# Altium schematic symbol library MCU_Microchip_ATmega.SchLib: 440 symbols (part 5 of 7) (continued)
## ATxmega16C4-M (continued)

## ATxmega16D4-A
designator *  value ATxmega16D4-A  Reference: U
ki_keywords: AVR 8/16bit Microcontroller XMegaAVR; ki_description: 32MHz, 16kB Flash, 4kB Boot, 2kB SRAM, 1kB EEPROM, JTAG, TQFP-44; ki_fp_filters: TQFP*10x10mm*P0.8mm*; Footprint: Package_QFP:TQFP-44_10x10mm_P0.8mm; Datasheet: http://ww1.microchip.com/downloads/en/DeviceDoc/Atmel-8135-8-and-16-bit-AVR-microcontroller-ATxmega16D4-32D4-64D4-128D4_datasheet.pdf
pins: 1 PA5, 2 PA6, 3 PA7, 4 AREF/PB0, 5 PB1, 6 PB2, 7 PB3, 8 GND, 9 VCC, 10 PC0, 11 PC1, 12 PC2, 13 PC3, 14 PC4, 15 PC5, 16 PC6, 17 PC7, 18 GND hidden, 19 VCC hidden, 20 PD0, 21 PD1, 22 PD2, 23 PD3, 24 PD4, 25 PD5, 26 PD6, 27 PD7, 28 PE0, 29 PE1, 30 GND hidden, 31 VCC hidden, 32 PE2, 33 PE3, 34 PDI_DATA, 35 ~{{RESET}/PDI_CLK}, 36 PR0/XTAL2, 37 PR1/XTAL1, 38 GND hidden, 39 AVCC, 40 AREF/PA0, 41 PA1, 42 PA2, 43 PA3, 44 PA4

## ATxmega16D4-C
designator *  value ATxmega16D4-C  Reference: U
ki_keywords: AVR 8/16bit Microcontroller XMegaAVR; ki_description: 32MHz, 16kB Flash, 4kB Boot, 2kB SRAM, 1kB EEPROM, JTAG, VFBGA-49; ki_fp_filters: VFBGA*5.0x5.0mm*Layout7x7*P0.65mm*; Footprint: Package_BGA:VFBGA-49_5.0x5.0mm_Layout7x7_P0.65mm; Datasheet: http://ww1.microchip.com/downloads/en/DeviceDoc/Atmel-8135-8-and-16-bit-AVR-microcontroller-ATxmega16D4-32D4-64D4-128D4_datasheet.pdf
pins: A1 PA3, A2 AVCC, A3 GND, A4 PR1/XTAL1, A5 PR0/XTAL2, A6 PDI_DATA, A7 PE3, B1 PA4, B2 PA1, B3 AREF/PA0, B4 GND hidden, B5 ~{{RESET}/PDI_CLK}, B6 PE2, B7 VCC, C1 PA5, C2 PA2, C3 PA6, C4 PA7, C5 GND hidden, C6 PE1, C7 GND hidden, D1 PB1, D2 PB2, D3 PB3, D4 AREF/PB0, D5 GND hidden, D6 PD7, D7 PE0, E1 GND hidden, E2 GND hidden, E3 PC3, E4 GND hidden, E5 PD4, E6 PD5, E7 PD6, F1 VCC hidden, F2 PC0, F3 PC4, F4 PC6, F5 PD0, F6 PD1, F7 PD3, G1 PC1, G2 PC2, G3 PC5, G4 PC7, G5 GND hidden, G6 VCC hidden, G7 PD2

## ATxmega16D4-M
designator *  value ATxmega16D4-M  Reference: U
ki_keywords: AVR 8/16bit Microcontroller XMegaAVR; ki_description: 32MHz, 16kB Flash, 4kB Boot, 2kB SRAM, 1kB EEPROM, JTAG, QFN-44; ki_fp_filters: QFN*1EP*7x7mm*P0.5mm*; Footprint: Package_DFN_QFN:QFN-44-1EP_7x7mm_P0.5mm_EP5.2x5.2mm; Datasheet: http://ww1.microchip.com/downloads/en/DeviceDoc/Atmel-8135-8-and-16-bit-AVR-microcontroller-ATxmega16D4-32D4-64D4-128D4_datasheet.pdf
pins: 1 PA5, 2 PA6, 3 PA7, 4 AREF/PB0, 5 PB1, 6 PB2, 7 PB3, 8 GND, 9 VCC, 10 PC0, 11 PC1, 12 PC2, 13 PC3, 14 PC4, 15 PC5, 16 PC6, 17 PC7, 18 GND hidden, 19 VCC hidden, 20 PD0, 21 PD1, 22 PD2, 23 PD3, 24 PD4, 25 PD5, 26 PD6, 27 PD7, 28 PE0, 29 PE1, 30 GND hidden, 31 VCC hidden, 32 PE2, 33 PE3, 34 PDI_DATA, 35 ~{{RESET}/PDI_CLK}, 36 PR0/XTAL2, 37 PR1/XTAL1, 38 GND hidden, 39 AVCC, 40 AREF/PA0, 41 PA1, 42 PA2, 43 PA3, 44 PA4, 45 GND hidden

## ATxmega16E5-A
designator *  value ATxmega16E5-A  Reference: U
ki_keywords: AVR 8/16bit Microcontroller XMegaAVR; ki_description: 32MHz, 16kB Flash, 4kB Boot, 2kB SRAM, 512B EEPROM, TQFP-32; ki_fp_filters: TQFP*7x7mm*P0.8mm*; Footprint: Package_QFP:TQFP-32_7x7mm_P0.8mm; Datasheet: http://ww1.microchip.com/downloads/en/DeviceDoc/Atmel-8153-8-and-16-bit-AVR-Microcontroller-XMEGA-E-ATxmega8E5-ATxmega16E5-ATxmega32E5_Datasheet.pdf
pins: 1 GND, 2 PA4, 3 PA3, 4 PA2, 5 PA1, 6 AREF/PA0, 7 PDI_DATA, 8 ~{{RESET}/PDI_CLK}, 9 PC7, 10 PC6, 11 PC5, 12 PC4, 13 PC3, 14 PC2, 15 PC1, 16 PC0, 17 VCC, 18 GND hidden, 19 PR1/XTAL1, 20 PR0/XTAL2, 21 PD7, 22 PD6, 23 PD5, 24 PD4, 25 PD3, 26 PD2, 27 PD1, 28 PD0/AREF, 29 PA7, 30 PA6, 31 PA5, 32 AVCC

## ATxmega16E5-M
designator *  value ATxmega16E5-M  Reference: U
ki_keywords: AVR 8/16bit Microcontroller XMegaAVR; ki_description: 32MHz, 16kB Flash, 4kB Boot, 2kB SRAM, 512B EEPROM, QFN-32; ki_fp_filters: QFN*1EP*5x5mm*P0.5mm*; Footprint: Package_DFN_QFN:QFN-32-1EP_5x5mm_P0.5mm_EP3.1x3.1mm; Datasheet: http://ww1.microchip.com/downloads/en/DeviceDoc/Atmel-8153-8-and-16-bit-AVR-Microcontroller-XMEGA-E-ATxmega8E5-ATxmega16E5-ATxmega32E5_Datasheet.pdf
pins: 1 GND, 2 PA4, 3 PA3, 4 PA2, 5 PA1, 6 AREF/PA0, 7 PDI_DATA, 8 ~{{RESET}/PDI_CLK}, 9 PC7, 10 PC6, 11 PC5, 12 PC4, 13 PC3, 14 PC2, 15 PC1, 16 PC0, 17 VCC, 18 GND hidden, 19 PR1/XTAL1, 20 PR0/XTAL2, 21 PD7, 22 PD6, 23 PD5, 24 PD4, 25 PD3, 26 PD2, 27 PD1, 28 PD0/AREF, 29 PA7, 30 PA6, 31 PA5, 32 AVCC, 33 GND hidden

## ATxmega16E5-M4
designator *  value ATxmega16E5-M4  Reference: U
ki_keywords: AVR 8/16bit Microcontroller XMegaAVR; ki_description: 32MHz, 16kB Flash, 4kB Boot, 2kB SRAM, 512B EEPROM, QFN-32; ki_fp_filters: QFN*1EP*4x4mm*P0.4mm*; Footprint: Package_DFN_QFN:QFN-32-1EP_4x4mm_P0.4mm_EP2.9x2.9mm; Datasheet: http://ww1.microchip.com/downloads/en/DeviceDoc/Atmel-8153-8-and-16-bit-AVR-Microcontroller-XMEGA-E-ATxmega8E5-ATxmega16E5-ATxmega32E5_Datasheet.pdf
pins: 1 GND, 2 PA4, 3 PA3, 4 PA2, 5 PA1, 6 AREF/PA0, 7 PDI_DATA, 8 ~{{RESET}/PDI_CLK}, 9 PC7, 10 PC6, 11 PC5, 12 PC4, 13 PC3, 14 PC2, 15 PC1, 16 PC0, 17 VCC, 18 GND hidden, 19 PR1/XTAL1, 20 PR0/XTAL2, 21 PD7, 22 PD6, 23 PD5, 24 PD4, 25 PD3, 26 PD2, 27 PD1, 28 PD0/AREF, 29 PA7, 30 PA6, 31 PA5, 32 AVCC, 33 GND hidden

## ATxmega32A4U-A
designator *  value ATxmega32A4U-A  Reference: U
ki_keywords: AVR 8/16bit Microcontroller XMegaAVR; ki_description: 32MHz, 32kB Flash, 4kB Boot, 4kB SRAM, 1kB EEPROM, JTAG, USB, TQFP-44; ki_fp_filters: TQFP*10x10mm*P0.8mm*; Footprint: Package_QFP:TQFP-44_10x10mm_P0.8mm; Datasheet: http://ww1.microchip.com/downloads/en/DeviceDoc/Atmel-8387-8-and16-bit-AVR-Microcontroller-XMEGA-A4U_Datasheet.pdf
pins: 1 PA5, 2 PA6, 3 PA7, 4 AREFB/PB0, 5 PB1, 6 PB2, 7 PB3, 8 GND, 9 VCC, 10 PC0, 11 PC1, 12 PC2, 13 PC3, 14 PC4, 15 PC5, 16 PC6, 17 PC7, 18 GND hidden, 19 VCC hidden, 20 PD0, 21 PD1, 22 PD2, 23 PD3, 24 PD4, 25 PD5, 26 PD6, 27 PD7, 28 PE0, 29 PE1, 30 GND hidden, 31 VCC hidden, 32 PE2, 33 PE3, 34 PDI_DATA, 35 ~{{RESET}/PDI_CLK}, 36 PR0/XTAL2, 37 PR1/XTAL1, 38 GND hidden, 39 AVCC, 40 AREFA/PA0, 41 PA1, 42 PA2, 43 PA3, 44 PA4

## ATxmega32A4U-C
designator *  value ATxmega32A4U-C  Reference: U
ki_keywords: AVR 8/16bit Microcontroller XMegaAVR; ki_description: 32MHz, 32kB Flash, 4kB Boot, 4kB SRAM, 1kB EEPROM, JTAG, USB, VFBGA-49; ki_fp_filters: VFBGA*5.0x5.0mm*Layout7x7*P0.65mm*; Footprint: Package_BGA:VFBGA-49_5.0x5.0mm_Layout7x7_P0.65mm; Datasheet: http://ww1.microchip.com/downloads/en/DeviceDoc/Atmel-8387-8-and16-bit-AVR-Microcontroller-XMEGA-A4U_Datasheet.pdf
pins: A1 PA3, A2 AVCC, A3 GND, A4 PR1/XTAL1, A5 PR0/XTAL2, A6 PDI_DATA, A7 PE3, B1 PA4, B2 PA1, B3 AREFA/PA0, B4 GND hidden, B5 ~{{RESET}/PDI_CLK}, B6 PE2, B7 VCC, C1 PA5, C2 PA2, C3 PA6, C4 PA7, C5 GND hidden, C6 PE1, C7 GND hidden, D1 PB1, D2 PB2, D3 PB3, D4 AREFB/PB0, D5 GND hidden, D6 PD7, D7 PE0, E1 GND hidden, E2 GND hidden, E3 PC3, E4 GND hidden, E5 PD4, E6 PD5, E7 PD6, F1 VCC hidden, F2 PC0, F3 PC4, F4 PC6, F5 PD0, F6 PD1, F7 PD3, G1 PC1, G2 PC2, G3 PC5, G4 PC7, G5 GND hidden, G6 VCC hidden, G7 PD2

## ATxmega32A4U-M
designator *  value ATxmega32A4U-M  Reference: U
ki_keywords: AVR 8/16bit Microcontroller XMegaAVR; ki_description: 32MHz, 32kB Flash, 4kB Boot, 4kB SRAM, 1kB EEPROM, JTAG, USB, QFN-44; ki_fp_filters: QFN*1EP*7x7mm*P0.5mm*; Footprint: Package_DFN_QFN:QFN-44-1EP_7x7mm_P0.5mm_EP5.2x5.2mm; Datasheet: http://ww1.microchip.com/downloads/en/DeviceDoc/Atmel-8387-8-and16-bit-AVR-Microcontroller-XMEGA-A4U_Datasheet.pdf
pins: 1 PA5, 2 PA6, 3 PA7, 4 AREFB/PB0, 5 PB1, 6 PB2, 7 PB3, 8 GND, 9 VCC, 10 PC0, 11 PC1, 12 PC2, 13 PC3, 14 PC4, 15 PC5, 16 PC6, 17 PC7, 18 GND hidden, 19 VCC hidden, 20 PD0, 21 PD1, 22 PD2, 23 PD3, 24 PD4, 25 PD5, 26 PD6, 27 PD7, 28 PE0, 29 PE1, 30 GND hidden, 31 VCC hidden, 32 PE2, 33 PE3, 34 PDI_DATA, 35 ~{{RESET}/PDI_CLK}, 36 PR0/XTAL2, 37 PR1/XTAL1, 38 GND hidden, 39 AVCC, 40 AREFA/PA0, 41 PA1, 42 PA2, 43 PA3, 44 PA4, 45 GND hidden

## ATxmega32C3-A
designator *  value ATxmega32C3-A  Reference: U
ki_keywords: AVR 8/16bit Microcontroller XMegaAVR; ki_description: 32MHz, 32kB Flash, 4kB Boot, 4kB SRAM, 1kB EEPROM, JTAG, USB, TQFP-64; ki_fp_filters: TQFP*14x14mm*P0.8mm*; Footprint: Package_QFP:TQFP-64_14x14mm_P0.8mm; Datasheet: http://ww1.microchip.com/downloads/en/DeviceDoc/Atmel-8492-8-and-16-bit-AVR-microcontroller-ATxmega32C3_64C3_128C3_192C3_256C3_datasheet.pdf
pins: 1 PA3, 2 PA4, 3 PA5, 4 PA6, 5 PA7, 6 AREFB/PB0, 7 PB1, 8 PB2, 9 PB3, 10 PB4, 11 PB5, 12 PB6, 13 PB7, 14 GND, 15 VCC, 16 PC0, 17 PC1, 18 PC2, 19 PC3, 20 PC4, 21 PC5, 22 PC6, 23 PC7, 24 GND hidden, 25 VCC hidden, 26 PD0, 27 PD1, 28 PD2, 29 PD3, 30 PD4, 31 PD5, 32 PD6, 33 PD7, 34 GND hidden, 35 VCC hidden, 36 PE0, 37 PE1, 38 PE2, 39 PE3, 40 PE4, 41 PE5, 42 PE6, 43 PE7, 44 GND hidden, 45 VCC hidden, 46 PF0, 47 PF1, 48 PF2, 49 PF3, 50 PF4, 51 PF5, 52 GND hidden, 53 VCC hidden, 54 PF6, 55 PF7, 56 PDI_DATA, 57 ~{{RESET}/PDI_CLK}, 58 PR0/XTAL2, 59 PR1/XTAL1, 60 GND hidden, 61 AVCC, 62 AREFA/PA0, 63 PA1, 64 PA2

## ATxmega32C3-M
designator *  value ATxmega32C3-M  Reference: U
ki_keywords: AVR 8/16bit Microcontroller XMegaAVR; ki_description: 32MHz, 32kB Flash, 4kB Boot, 4kB SRAM, 1kB EEPROM, JTAG, USB, QFN-64; ki_fp_filters: QFN*1EP*9x9mm*P0.5mm*; Footprint: Package_DFN_QFN:QFN-64-1EP_9x9mm_P0.5mm_EP7.65x7.65mm; Datasheet: http://ww1.microchip.com/downloads/en/DeviceDoc/Atmel-8492-8-and-16-bit-AVR-microcontroller-ATxmega32C3_64C3_128C3_192C3_256C3_datasheet.pdf
pins: 1 PA3, 2 PA4, 3 PA5, 4 PA6, 5 PA7, 6 AREFB/PB0, 7 PB1, 8 PB2, 9 PB3, 10 PB4, 11 PB5, 12 PB6, 13 PB7, 14 GND, 15 VCC, 16 PC0, 17 PC1, 18 PC2, 19 PC3, 20 PC4, 21 PC5, 22 PC6, 23 PC7, 24 GND hidden, 25 VCC hidden, 26 PD0, 27 PD1, 28 PD2, 29 PD3, 30 PD4, 31 PD5, 32 PD6, 33 PD7, 34 GND hidden, 35 VCC hidden, 36 PE0, 37 PE1, 38 PE2, 39 PE3, 40 PE4, 41 PE5, 42 PE6, 43 PE7, 44 GND hidden, 45 VCC hidden, 46 PF0, 47 PF1, 48 PF2, 49 PF3, 50 PF4, 51 PF5, 52 GND hidden, 53 VCC hidden, 54 PF6, 55 PF7, 56 PDI_DATA, 57 ~{{RESET}/PDI_CLK}, 58 PR0/XTAL2, 59 PR1/XTAL1, 60 GND hidden, 61 AVCC, 62 AREFA/PA0, 63 PA1, 64 PA2, 65 GND hidden

## ATxmega32C4-A
designator *  value ATxmega32C4-A  Reference: U
ki_keywords: AVR 8/16bit Microcontroller XMegaAVR; ki_description: 32MHz, 32kB Flash, 4kB Boot, 4kB SRAM, 1kB EEPROM, JTAG, TQFP-44; ki_fp_filters: TQFP*10x10mm*P0.8mm*; Footprint: Package_QFP:TQFP-44_10x10mm_P0.8mm; Datasheet: http://ww1.microchip.com/downloads/en/DeviceDoc/Atmel-8493-8-and-32-bit-AVR-XMEGA-Microcontrollers-ATxmega16C4-ATxmega32C4_Datasheet.pdf
pins: 1 PA5, 2 PA6, 3 PA7, 4 AREFB/PB0, 5 PB1, 6 PB2, 7 PB3, 8 GND, 9 VCC, 10 PC0, 11 PC1, 12 PC2, 13 PC3, 14 PC4, 15 PC5, 16 PC6, 17 PC7, 18 GND hidden, 19 VCC hidden, 20 PD0, 21 PD1, 22 PD2, 23 PD3, 24 PD4, 25 PD5, 26 PD6, 27 PD7, 28 PE0, 29 PE1, 30 GND hidden, 31 VCC hidden, 32 PE2, 33 PE3, 34 PDI_DATA, 35 ~{{RESET}/PDI_CLK}, 36 PR0/XTAL1, 37 PR1/XTAL2, 38 GND hidden, 39 AVCC, 40 AREFA/PA0, 41 PA1, 42 PA2, 43 PA3, 44 PA4

## ATxmega32C4-C
designator *  value ATxmega32C4-C  Reference: U
ki_keywords: AVR 8/16bit Microcontroller XMegaAVR; ki_description: 32MHz, 32kB Flash, 4kB Boot, 4kB SRAM, 1kB EEPROM, JTAG, VFBGA-49; ki_fp_filters: VFBGA*5.0x5.0mm*Layout7x7*P0.65mm*; Footprint: Package_BGA:VFBGA-49_5.0x5.0mm_Layout7x7_P0.65mm; Datasheet: http://ww1.microchip.com/downloads/en/DeviceDoc/Atmel-8493-8-and-32-bit-AVR-XMEGA-Microcontrollers-ATxmega16C4-ATxmega32C4_Datasheet.pdf
pins: A1 PA3, A2 AVCC, A3 GND, A4 PR1/XTAL2, A5 PR0/XTAL1, A6 PDI_DATA, A7 PE3, B1 PA4, B2 PA1, B3 AREFA/PA0, B4 GND hidden, B5 ~{{RESET}/PDI_CLK}, B6 PE2, B7 VCC, C1 PA5, C2 PA2, C3 PA6, C4 PA7, C5 GND hidden, C6 PE1, C7 GND hidden, D1 PB1, D2 PB2, D3 PB3, D4 AREFB/PB0, D5 GND hidden, D6 PD7, D7 PE0, E1 GND hidden, E2 GND hidden, E3 PC3, E4 GND hidden, E5 PD4, E6 PD5, E7 PD6, F1 VCC hidden, F2 PC0, F3 PC4, F4 PC6, F5 PD0, F6 PD1, F7 PD3, G1 PC1, G2 PC2, G3 PC5, G4 PC7, G5 GND hidden, G6 VCC hidden, G7 PD2

## ATxmega32C4-M
designator *  value ATxmega32C4-M  Reference: U
ki_keywords: AVR 8/16bit Microcontroller XMegaAVR; ki_description: 32MHz, 32kB Flash, 4kB Boot, 4kB SRAM, 1kB EEPROM, JTAG, QFN-44; ki_fp_filters: QFN*1EP*7x7mm*P0.5mm*; Footprint: Package_DFN_QFN:QFN-44-1EP_7x7mm_P0.5mm_EP5.2x5.2mm; Datasheet: http://ww1.microchip.com/downloads/en/DeviceDoc/Atmel-8493-8-and-32-bit-AVR-XMEGA-Microcontrollers-ATxmega16C4-ATxmega32C4_Datasheet.pdf
pins: 1 PA5, 2 PA6, 3 PA7, 4 AREFB/PB0, 5 PB1, 6 PB2, 7 PB3, 8 GND, 9 VCC, 10 PC0, 11 PC1, 12 PC2, 13 PC3, 14 PC4, 15 PC5, 16 PC6, 17 PC7, 18 GND hidden, 19 VCC hidden, 20 PD0, 21 PD1, 22 PD2, 23 PD3, 24 PD4, 25 PD5, 26 PD6, 27 PD7, 28 PE0, 29 PE1, 30 GND hidden, 31 VCC hidden, 32 PE2, 33 PE3, 34 PDI_DATA, 35 ~{{RESET}/PDI_CLK}, 36 PR0/XTAL1, 37 PR1/XTAL2, 38 GND hidden, 39 AVCC, 40 AREFA/PA0, 41 PA1, 42 PA2, 43 PA3, 44 PA4, 45 GND hidden

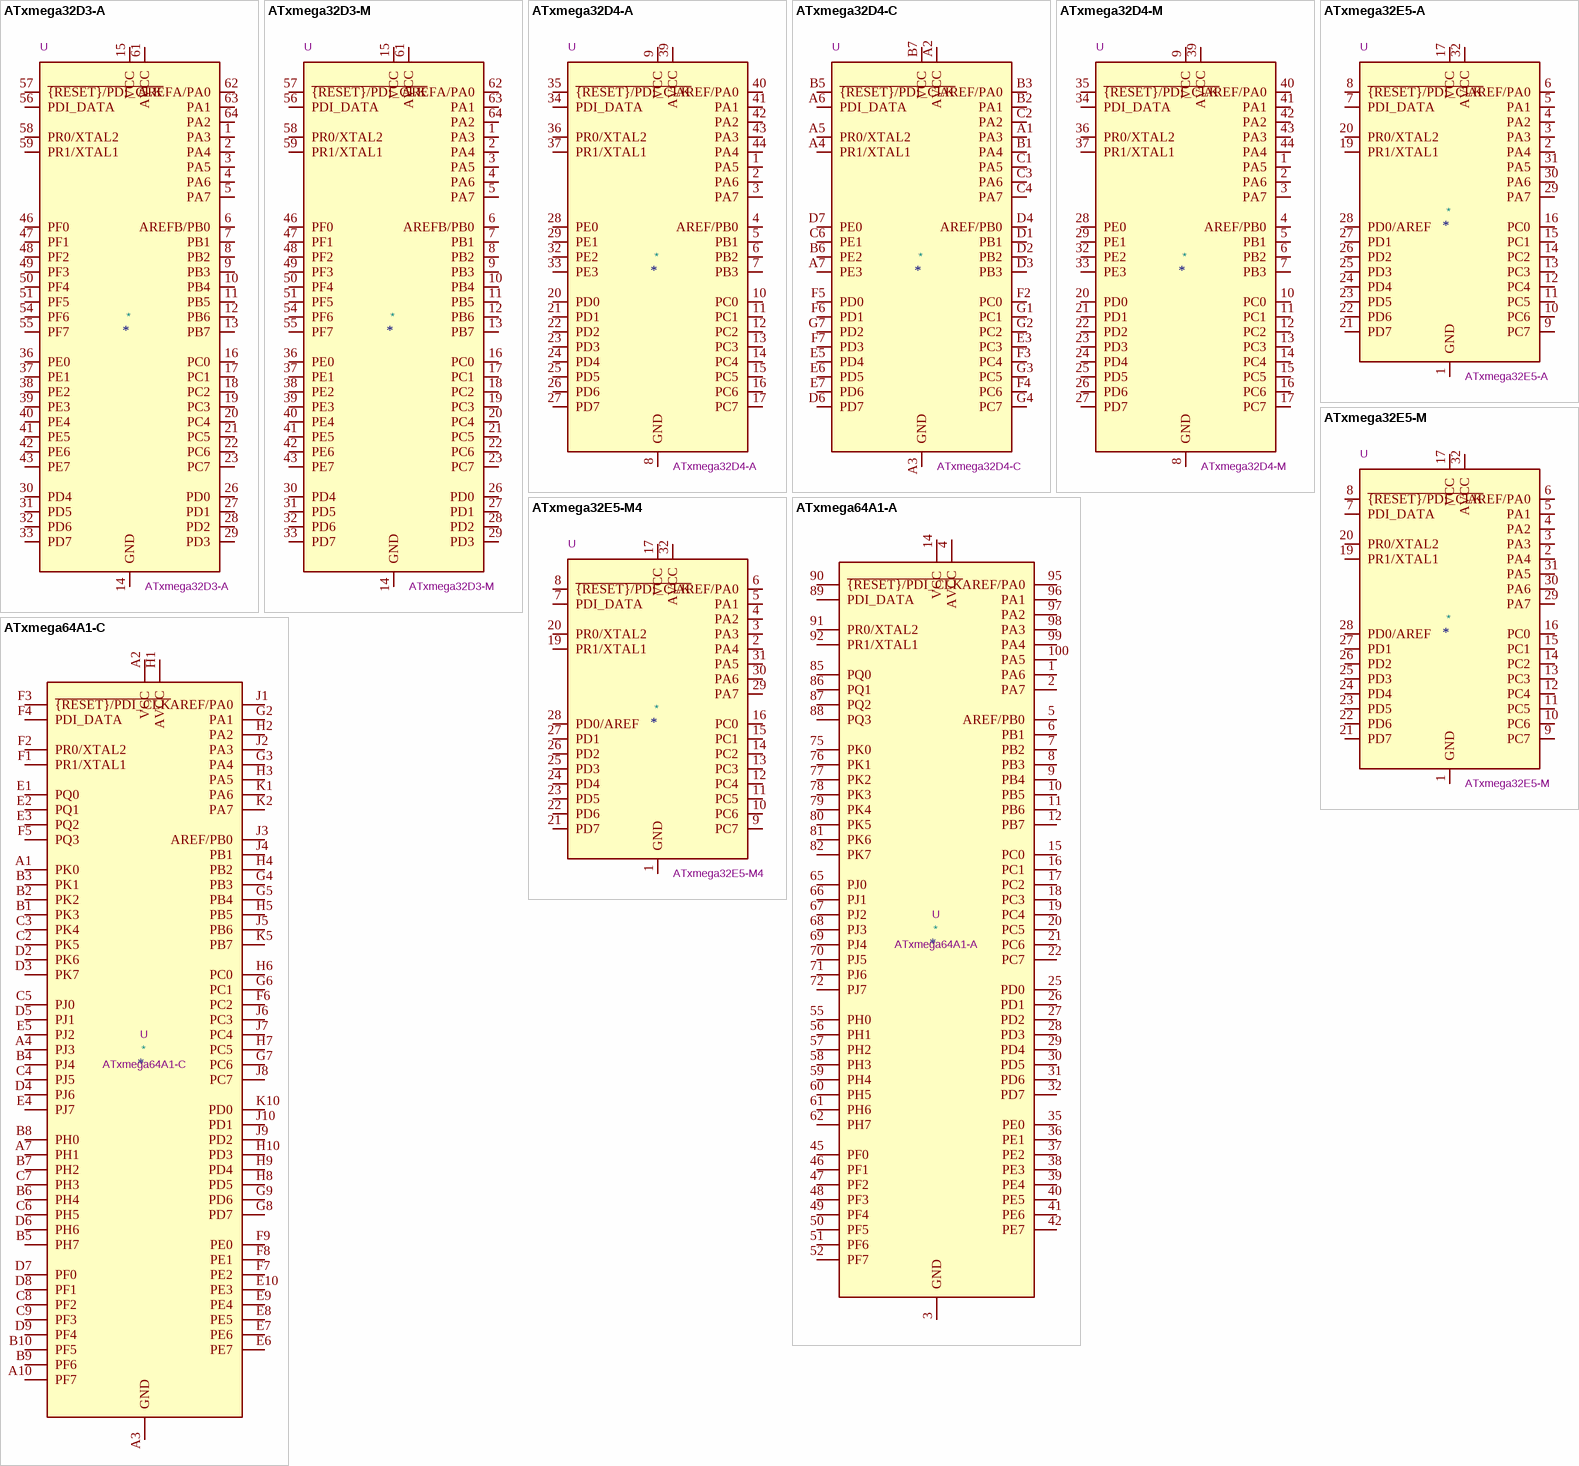
[diagram p32: symbols ATxmega32D3-A to ATxmega64A1-C]

## ATxmega32D3-A
designator *  value ATxmega32D3-A  Reference: U
ki_keywords: AVR 8/16bit Microcontroller XMegaAVR; ki_description: 32MHz, 32kB Flash, 4kB Boot, 4kB SRAM, 1kB EEPROM, JTAG, TQFP-64; ki_fp_filters: TQFP*14x14mm*P0.8mm*; Footprint: Package_QFP:TQFP-64_14x14mm_P0.8mm; Datasheet: http://ww1.microchip.com/downloads/en/DeviceDoc/Atmel-8134-8-16-bit-Atmel-XMEGA-D3-Microcontroller_Datasheet.pdf
pins: 1 PA3, 2 PA4, 3 PA5, 4 PA6, 5 PA7, 6 AREFB/PB0, 7 PB1, 8 PB2, 9 PB3, 10 PB4, 11 PB5, 12 PB6, 13 PB7, 14 GND, 15 VCC, 16 PC0, 17 PC1, 18 PC2, 19 PC3, 20 PC4, 21 PC5, 22 PC6, 23 PC7, 24 GND hidden, 25 VCC hidden, 26 PD0, 27 PD1, 28 PD2, 29 PD3, 30 PD4, 31 PD5, 32 PD6, 33 PD7, 34 GND hidden, 35 VCC hidden, 36 PE0, 37 PE1, 38 PE2, 39 PE3, 40 PE4, 41 PE5, 42 PE6, 43 PE7, 44 GND hidden, 45 VCC hidden, 46 PF0, 47 PF1, 48 PF2, 49 PF3, 50 PF4, 51 PF5, 52 GND hidden, 53 VCC hidden, 54 PF6, 55 PF7, 56 PDI_DATA, 57 ~{{RESET}/PDI_CLK}, 58 PR0/XTAL2, 59 PR1/XTAL1, 60 GND hidden, 61 AVCC, 62 AREFA/PA0, 63 PA1, 64 PA2

## ATxmega32D3-M
designator *  value ATxmega32D3-M  Reference: U
ki_keywords: AVR 8/16bit Microcontroller XMegaAVR; ki_description: 32MHz, 32kB Flash, 4kB Boot, 4kB SRAM, 1kB EEPROM, JTAG, QFN-64; ki_fp_filters: QFN*1EP*9x9mm*P0.5mm*; Footprint: Package_DFN_QFN:QFN-64-1EP_9x9mm_P0.5mm_EP7.65x7.65mm; Datasheet: http://ww1.microchip.com/downloads/en/DeviceDoc/Atmel-8134-8-16-bit-Atmel-XMEGA-D3-Microcontroller_Datasheet.pdf
pins: 1 PA3, 2 PA4, 3 PA5, 4 PA6, 5 PA7, 6 AREFB/PB0, 7 PB1, 8 PB2, 9 PB3, 10 PB4, 11 PB5, 12 PB6, 13 PB7, 14 GND, 15 VCC, 16 PC0, 17 PC1, 18 PC2, 19 PC3, 20 PC4, 21 PC5, 22 PC6, 23 PC7, 24 GND hidden, 25 VCC hidden, 26 PD0, 27 PD1, 28 PD2, 29 PD3, 30 PD4, 31 PD5, 32 PD6, 33 PD7, 34 GND hidden, 35 VCC hidden, 36 PE0, 37 PE1, 38 PE2, 39 PE3, 40 PE4, 41 PE5, 42 PE6, 43 PE7, 44 GND hidden, 45 VCC hidden, 46 PF0, 47 PF1, 48 PF2, 49 PF3, 50 PF4, 51 PF5, 52 GND hidden, 53 VCC hidden, 54 PF6, 55 PF7, 56 PDI_DATA, 57 ~{{RESET}/PDI_CLK}, 58 PR0/XTAL2, 59 PR1/XTAL1, 60 GND hidden, 61 AVCC, 62 AREFA/PA0, 63 PA1, 64 PA2, 65 GND hidden

## ATxmega32D4-A
designator *  value ATxmega32D4-A  Reference: U
ki_keywords: AVR 8/16bit Microcontroller XMegaAVR; ki_description: 32MHz, 32kB Flash, 4kB Boot, 4kB SRAM, 1kB EEPROM, JTAG, TQFP-44; ki_fp_filters: TQFP*10x10mm*P0.8mm*; Footprint: Package_QFP:TQFP-44_10x10mm_P0.8mm; Datasheet: http://ww1.microchip.com/downloads/en/DeviceDoc/Atmel-8135-8-and-16-bit-AVR-microcontroller-ATxmega16D4-32D4-64D4-128D4_datasheet.pdf
pins: 1 PA5, 2 PA6, 3 PA7, 4 AREF/PB0, 5 PB1, 6 PB2, 7 PB3, 8 GND, 9 VCC, 10 PC0, 11 PC1, 12 PC2, 13 PC3, 14 PC4, 15 PC5, 16 PC6, 17 PC7, 18 GND hidden, 19 VCC hidden, 20 PD0, 21 PD1, 22 PD2, 23 PD3, 24 PD4, 25 PD5, 26 PD6, 27 PD7, 28 PE0, 29 PE1, 30 GND hidden, 31 VCC hidden, 32 PE2, 33 PE3, 34 PDI_DATA, 35 ~{{RESET}/PDI_CLK}, 36 PR0/XTAL2, 37 PR1/XTAL1, 38 GND hidden, 39 AVCC, 40 AREF/PA0, 41 PA1, 42 PA2, 43 PA3, 44 PA4

## ATxmega32D4-C
designator *  value ATxmega32D4-C  Reference: U
ki_keywords: AVR 8/16bit Microcontroller XMegaAVR; ki_description: 32MHz, 32kB Flash, 4kB Boot, 4kB SRAM, 1kB EEPROM, JTAG, VFBGA-49; ki_fp_filters: VFBGA*5.0x5.0mm*Layout7x7*P0.65mm*; Footprint: Package_BGA:VFBGA-49_5.0x5.0mm_Layout7x7_P0.65mm; Datasheet: http://ww1.microchip.com/downloads/en/DeviceDoc/Atmel-8135-8-and-16-bit-AVR-microcontroller-ATxmega16D4-32D4-64D4-128D4_datasheet.pdf
pins: A1 PA3, A2 AVCC, A3 GND, A4 PR1/XTAL1, A5 PR0/XTAL2, A6 PDI_DATA, A7 PE3, B1 PA4, B2 PA1, B3 AREF/PA0, B4 GND hidden, B5 ~{{RESET}/PDI_CLK}, B6 PE2, B7 VCC, C1 PA5, C2 PA2, C3 PA6, C4 PA7, C5 GND hidden, C6 PE1, C7 GND hidden, D1 PB1, D2 PB2, D3 PB3, D4 AREF/PB0, D5 GND hidden, D6 PD7, D7 PE0, E1 GND hidden, E2 GND hidden, E3 PC3, E4 GND hidden, E5 PD4, E6 PD5, E7 PD6, F1 VCC hidden, F2 PC0, F3 PC4, F4 PC6, F5 PD0, F6 PD1, F7 PD3, G1 PC1, G2 PC2, G3 PC5, G4 PC7, G5 GND hidden, G6 VCC hidden, G7 PD2

## ATxmega32D4-M
designator *  value ATxmega32D4-M  Reference: U
ki_keywords: AVR 8/16bit Microcontroller XMegaAVR; ki_description: 32MHz, 32kB Flash, 4kB Boot, 4kB SRAM, 1kB EEPROM, JTAG, QFN-44; ki_fp_filters: QFN*1EP*7x7mm*P0.5mm*; Footprint: Package_DFN_QFN:QFN-44-1EP_7x7mm_P0.5mm_EP5.2x5.2mm; Datasheet: http://ww1.microchip.com/downloads/en/DeviceDoc/Atmel-8135-8-and-16-bit-AVR-microcontroller-ATxmega16D4-32D4-64D4-128D4_datasheet.pdf
pins: 1 PA5, 2 PA6, 3 PA7, 4 AREF/PB0, 5 PB1, 6 PB2, 7 PB3, 8 GND, 9 VCC, 10 PC0, 11 PC1, 12 PC2, 13 PC3, 14 PC4, 15 PC5, 16 PC6, 17 PC7, 18 GND hidden, 19 VCC hidden, 20 PD0, 21 PD1, 22 PD2, 23 PD3, 24 PD4, 25 PD5, 26 PD6, 27 PD7, 28 PE0, 29 PE1, 30 GND hidden, 31 VCC hidden, 32 PE2, 33 PE3, 34 PDI_DATA, 35 ~{{RESET}/PDI_CLK}, 36 PR0/XTAL2, 37 PR1/XTAL1, 38 GND hidden, 39 AVCC, 40 AREF/PA0, 41 PA1, 42 PA2, 43 PA3, 44 PA4, 45 GND hidden

## ATxmega32E5-A
designator *  value ATxmega32E5-A  Reference: U
ki_keywords: AVR 8/16bit Microcontroller XMegaAVR; ki_description: 32MHz, 32kB Flash, 4kB Boot, 4kB SRAM, 1kB EEPROM, TQFP-32; ki_fp_filters: TQFP*7x7mm*P0.8mm*; Footprint: Package_QFP:TQFP-32_7x7mm_P0.8mm; Datasheet: http://ww1.microchip.com/downloads/en/DeviceDoc/Atmel-8153-8-and-16-bit-AVR-Microcontroller-XMEGA-E-ATxmega8E5-ATxmega16E5-ATxmega32E5_Datasheet.pdf
pins: 1 GND, 2 PA4, 3 PA3, 4 PA2, 5 PA1, 6 AREF/PA0, 7 PDI_DATA, 8 ~{{RESET}/PDI_CLK}, 9 PC7, 10 PC6, 11 PC5, 12 PC4, 13 PC3, 14 PC2, 15 PC1, 16 PC0, 17 VCC, 18 GND hidden, 19 PR1/XTAL1, 20 PR0/XTAL2, 21 PD7, 22 PD6, 23 PD5, 24 PD4, 25 PD3, 26 PD2, 27 PD1, 28 PD0/AREF, 29 PA7, 30 PA6, 31 PA5, 32 AVCC

## ATxmega32E5-M
designator *  value ATxmega32E5-M  Reference: U
ki_keywords: AVR 8/16bit Microcontroller XMegaAVR; ki_description: 32MHz, 32kB Flash, 4kB Boot, 4kB SRAM, 1kB EEPROM, QFN-32; ki_fp_filters: QFN*1EP*5x5mm*P0.5mm*; Footprint: Package_DFN_QFN:QFN-32-1EP_5x5mm_P0.5mm_EP3.1x3.1mm; Datasheet: http://ww1.microchip.com/downloads/en/DeviceDoc/Atmel-8153-8-and-16-bit-AVR-Microcontroller-XMEGA-E-ATxmega8E5-ATxmega16E5-ATxmega32E5_Datasheet.pdf
pins: 1 GND, 2 PA4, 3 PA3, 4 PA2, 5 PA1, 6 AREF/PA0, 7 PDI_DATA, 8 ~{{RESET}/PDI_CLK}, 9 PC7, 10 PC6, 11 PC5, 12 PC4, 13 PC3, 14 PC2, 15 PC1, 16 PC0, 17 VCC, 18 GND hidden, 19 PR1/XTAL1, 20 PR0/XTAL2, 21 PD7, 22 PD6, 23 PD5, 24 PD4, 25 PD3, 26 PD2, 27 PD1, 28 PD0/AREF, 29 PA7, 30 PA6, 31 PA5, 32 AVCC, 33 GND hidden

## ATxmega32E5-M4
designator *  value ATxmega32E5-M4  Reference: U
ki_keywords: AVR 8/16bit Microcontroller XMegaAVR; ki_description: 32MHz, 32kB Flash, 4kB Boot, 4kB SRAM, 1kB EEPROM, QFN-32; ki_fp_filters: QFN*1EP*4x4mm*P0.4mm*; Footprint: Package_DFN_QFN:QFN-32-1EP_4x4mm_P0.4mm_EP2.9x2.9mm; Datasheet: http://ww1.microchip.com/downloads/en/DeviceDoc/Atmel-8153-8-and-16-bit-AVR-Microcontroller-XMEGA-E-ATxmega8E5-ATxmega16E5-ATxmega32E5_Datasheet.pdf
pins: 1 GND, 2 PA4, 3 PA3, 4 PA2, 5 PA1, 6 AREF/PA0, 7 PDI_DATA, 8 ~{{RESET}/PDI_CLK}, 9 PC7, 10 PC6, 11 PC5, 12 PC4, 13 PC3, 14 PC2, 15 PC1, 16 PC0, 17 VCC, 18 GND hidden, 19 PR1/XTAL1, 20 PR0/XTAL2, 21 PD7, 22 PD6, 23 PD5, 24 PD4, 25 PD3, 26 PD2, 27 PD1, 28 PD0/AREF, 29 PA7, 30 PA6, 31 PA5, 32 AVCC, 33 GND hidden